# Altium schematic symbol library CUSTOM SCH - Copy.SchLib: 494 symbols (part 2 of 6) (continued)
## FPC 15 Pin
designator J12, comment MIPI  (value not drawn)
15 Position FPC Connector Contacts, Vertical - 1 Sided Pitch  0.039" (1.00mm); Manufacturer Part Number: 1-1734248-5; Case/Package: SMD
footprint TE_1-1734248-5
footprint TE_1-1734248-5 (FPC 15 PIn 1mm pitch)
pins: 1, 2, 3, 4, 5, 6, 7, 8, 9, 10, 11, 12, 13, 14, 15

## FPC 20Pin P0.5
designator J?, comment F0501-B-20-20T-R  Case/Package: SMD,P=0.5mm
Manufacturer Part Number: F0501-B-20-20T-R
footprint FPC_20P-P0.50_L4.4-W15.6
pins: 1, 2, 3, 4, 5, 6, 7, 8, 9, 10, 11, 12, 13, 14, 15, 16, 17, 18, 19, 20

## FPC 26Pin P0.5_
designator J?, comment F0501-B-20-20T-R  Case/Package: SMD,P=0.5mm
Manufacturer Part Number: F0501-B-20-20T-R
footprint FPC_20P-P0.50_L4.4-W15.6
pins: 1, 2, 3, 4, 5, 6, 7, 8, 9, 10, 11, 12, 13, 14, 15, 16, 17, 18, 19, 20, 21, 22, 23, 24, 25, 26

## FPC 40 PIN
designator J?  Manufacturer Part Number: F0501-B-40-20T-R  Case/Package: SMD P=0.5mm
FFC/FPC Connector, 40 Pin  Slide Lock Contact,Bottom SMD,P=0.5mm
footprint F0501-B-40-20T-R
footprint F0501-B-40-20T-R
pins: 1, 2, 3, 4, 5, 6, 7, 8, 9, 10, 11, 12, 13, 14, 15, 16, 17, 18, 19, 20, 21, 22, 23, 24, 25, 26, 27, 28, 29, 30, 31, 32, 33, 34, 35, 36, 37, 38, 39, 40

## FR107
designator D?
Rectifiers 1.0 Amp 1000 Volt 150ns; Mfr. No: FR107; Value: Rectifiers 1.0 Amp 1000 Volt 150ns; Package: DO-41
footprint DO-41_VERTICAL (Diode, Axial; Body 5.2 x 2.7 mm (LxDia. max), Lead Dia. 0.86 mm (max))
pins: 1 K, 2 A

## FRC
designator J?
10 Pin FRC Box Header Vertical TH; Case/Package: TH; Manufacturer Part Number: 10 Pin FRC Box Header
footprint FRC_10PIN
pins: 1 3V3, 2 GND, 3 VSYNC, 4 SCL, 5 HREF, 6 SDA, 7 RESET, 8 D0, 9 D1, 10 D2

## FRC_1
designator J?
10 Pin FRC Box Header
footprint FRC_10PIN
pins: 1 3V3, 2 GND, 3 VSYNC, 4 SCL, 5 HREF, 6 SDA, 7 RESET, 8 D0, 9 D1, 10 D2

## FRC_2
designator J?
10 Pin FRC Box Header
footprint FRC_10PIN
pins: 11 D3, 12 D4, 13 D5, 14 D6, 15 D7, 16 PCLK, 17, 18 PWDN, 19, 20

## FS8205A
designator U?  (value not drawn)
Dual N-Channel Mosfet TSSOP-8 (Sunrom:5292); Value: 5.0A; Case/Package: TSSOP-8; Manufacturer Part Number: FS8205A
footprint TSSOP8
pins: 1, 2, 3, 4, 5, 6, 7, 8

## FSM2JSMA
designator S?
Grey Button Tactile Switch, SPST 50 mA 0.71mm Surface Mount; Manufacturer_Name: TE Connectivity; Manufacturer_Part_Number: FSM2JSMA; RS Part Number: 8750595; RS Price/Stock: http://uk.rs-online.com/web/p/products/8750595; Mouser Part Number: 506-FSM2JSMA; Mouser Price/Stock: https://www.mouser.com/Search/Refine.aspx?Keyword=506-FSM2JSMA; Datasheet Link: http://www.te.com/commerce/DocumentDelivery/DDEController?Action=showdoc&DocId=Customer+Drawing%7F2-1437565-7%7FV%7Fpdf%7FEnglish%7FENG_CD_2-1437565-7_V.pdf%7F2-1437565-7
footprint FSM2J
pins: 1, 2, 3, 4

## FT2232D
designator U?
Dual USB to Serial UART/FIFO IC; Manufacturer Part Number: FT2232D; Case/Package: LQFP-48
footprint FT2232D (48-LQFP (7x7))
pins: 1 EESK, 2 EEDATA, 3 VCC_1, 4 RESET#, 5 RSTOUT#, 6 3V3OUT, 7 USBDP, 8 USBDM, 9 GND_1, 10 SI/WUA, 11 ACBUS3, 12 ACBUS2, 13 ACBUS1, 14 VCCIOA, 15 ACBUS0, 16 ADBUS7, 17 ADBUS6, 18 GND_2, 19 ADBUS5, 20 ADBUS4, 21 ADBUS3, 22 ADBUS2, 23 ADBUS1, 24 ADBUS0, 25 GND_3, 26 SI/WUB, 27 BCBUS3, 28 BCBUS2, 29 BCBUS1, 30 BCBUS0, 31 VCCIOB, 32 BDBUS7, 33 BDBUS6, 34 GND_4, 35 BDBUS5, 36 BDBUS4, 37 BDBUS3, 38 BDBUS2, 39 BDBUS1, 40 BDBUS0, 41 PWREN#, 42 VCC_2, 43 XTIN, 44 XTOUT, 45 AGND, 46 AVCC, 47 TEST, 48 EECS

## FT4232H-56Q
designator U?  Manufacturer Part Number: FT4232H-56Q-REEL
USB Interface IC Quad 480Mbs 4 UART USB 2.0 12Mbit; Manufacturer: FTDI; Min Supply Voltage: 1.62V; Max Supply Voltage: 1.98V; Supplier 1: Digi-Key; RoHS: Yes; Category: Integrated Circuits (ICs); Pricing 1: 1=7.25000, 10=7.04000, 50=6.39000, 100=5.97000, 500=5.78004, 1000=5.39002 (USD); Case/Package: VQFN-56; Number of Pins: 64; Min Operating Temperature: -40°C; Max Operating Temperature: 85°C; Packaging: Tape and Reel; REACH SVHC: No SVHC; ComponentLink1URL: http://www.mouser.com/ds/2/163/DS_FT4232H-9150.pdf?src-supplier=Mouser; ComponentLink1Description: http://www.mouser.com/ds/2/163/DS_FT4232H-9150.pdf?src-supplier=Mouser; ComponentLink2URL: http://www.farnell.com/datasheets/2200174.pdf?src-supplier=Farnell; ComponentLink2Description: http://www.farnell.com/datasheets/2200174.pdf?src-supplier=Farnell; ComponentLink3URL: http://www.ftdichip.com/Support/Documents/AppNotes/AN_128_User_Guide_For_FT4232H_Factory%20test%20utility.pdf?src-supplier=Digi-Key; ComponentLink3Description: http://www.ftdichip.com/Support/Documents/AppNotes/AN_128_User_Guide_For_FT4232H_Factory%20test%20utility.pdf?src-supplier=Digi-Key; ComponentLink4URL: http://www.farnell.com/datasheets/2200174.pdf?src-supplier=Newark; ComponentLink4Description: http://www.farnell.com/datasheets/2200174.pdf?src-supplier=Newark; ComponentLink5URL: http://www.farnell.com/datasheets/2200174.pdf?src-supplier=Element14; ComponentLink5Description: http://www.farnell.com/datasheets/2200174.pdf?src-supplier=Element14; Supplier Part Number 1: 768-1378-1-ND
footprint VQFN-56(8x8)
pins: 1 EECS, 2 VCORE, 3 OSCI, 4 OSCO, 5 VPHY, 6 REF, 7 DM, 8 DP, 9 VPLL, 10 TEST, 11 ~{RESET}, 12 ADBUS0, 13 ADBUS1, 14 ADBUS2, 15 ADBUS3, 16 VCCIO, 17 ADBUS4, 18 ADBUS5, 19 ADBUS6, 20 ADBUS7, 21 GND, 22 BDBUS0, 23 BDBUS1, 24 BDBUS2, 25 BDBUS3, 26 BDBUS4, 27 BDBUS5, 28 BDBUS6, 29 BDBUS7, 30 ~{SUSPEND}, 31 VCORE, 32 CDBUS0, 33 CDBUS1, 34 CDBUS2, 35 CDBUS3, 36 VCCIO, 37 CDBUS4, 38 CDBUS5, 39 CDBUS6, 40 CDBUS7, 41 GND, 42 DDBUS0, 43 VREGOUT, 44 VREGIN, 45 GND, 46 DDBUS1, 47 DDBUS2, 48 DDBUS3, 49 DDBUS4, 50 VCCIO, 51 DDBUS5, 52 DDBUS6, 53 DDBUS7, 54 ~{PWREN}, 55 EEDATA, 56 EECLK, 57 GND

## FUSB302BMPX
designator U?  Case/Package: MLP 14 Leads  Manufacturer Part Number: FUSB302BMPX
Programmable USB Type-C Controller w/PD
footprint 14-MLP (2.5x2.5)
pins: 1 CC2_1, 2 VBUS, 3 VDD_3 (power), 4 VDD_4 (power), 5 INT#, 6 SCL, 7 SDA, 8 GND_8 (power), 9 GND_9 (power), 10 CC1_10, 11 CC1_11, 12 VCONN_12, 13 VCONN_13, 14 CC2_14, 15 ePAD (power)

## GDT
designator GT?
pins: 1, 2

## GHR-06V-S
designator J?
6 pin Receptable of SM06B; Manufacturer Part Number: GHR-06V-S; Case/Package: Receptable; Link: https://www.aliexpress.com/item/33046444051.html?spm=a2g0o.productlist.0.0.6905681c6A8VYp&algo_pvid=ada6543f-3082-480f-a1c6-79924c9b0228&algo_exp_id=ada6543f-3082-480f-a1c6-79924c9b0228-7&pdp_ext_f=%7B%22sku_id%22%3A%2267404086081%22%7D

## GHR-10V-S
designator J?
10 in Receptable of SM10B; Manufacturer Part Number: GHR-10V-S; Case/Package: Receptable; Link: https://www.aliexpress.com/item/33049565374.html?spm=a2g0o.detail.0.0.45723f4fL7lF9l&gps-id=pcDetailBottomMoreThisSeller&scm=1007.13339.169870.0&scm_id=1007.13339.169870.0&scm-url=1007.13339.169870.0&pvid=b199a0d8-d4aa-4a42-8de8-7d31300f8e50&_t=gps-id:pcDetailBottomMoreThisSeller,scm-url:1007.13339.169870.0,pvid:b199a0d8-d4aa-4a42-8de8-7d31300f8e50,tpp_buckets:668%232846%238111%231996&&pdp_ext_f=%7B%22sceneId%22:%223339%22,%22sku_id%22:%2267399547622%22%7D

## GL823
designator U?
USB 2.0 SD/MMC Card Reader Controller; Manufacturer Part Number: GL823; Case/Package: QFN24; Value: *
pins: 1 SCL, 2 SDA, 3 DM, 4 DP, 5 RREF, 6 AVDD, 7 RSTZ, 8 SD_WP, 9 SD_CDZ, 10 D1, 11 D0, 12 SD_CLK, 13 DVDD, 14 PMOS, 15 GPIO8, 16 SD_CMD, 17 GPIO9, 18 D3, 19 D2, 20 LED, 21 TEST, 22 GPIO3, 23 DVDD, 24 GND, 25 G1
text: Version (A)

## GL850G-HHY22
designator U?
USB 2.0 Hub Controller Support 4 downstream ports; Manufacturer Part Number: GL850G-HHY22; Case/Package: SSOP-28; Value: *
footprint SSOP-28
pins: 1 AVDD_1, 2 DM2, 3 DP2, 4 RREF, 5 AVDD_2, 6 X1, 7 X2, 8 DM3, 9 DP3, 10 AVDD_3, 11 DM4, 12 DP4, 13 RESET#, 14 TEST/SCL, 15 GND, 16 DVDD, 17 PSELF, 18 PGANG, 19 OVCUR2#, 20 PWREN2#, 21 OVCUR1#, 22 PWREN1#, 23 V5, 24 V33, 25 DM0, 26 DP0, 27 DM1, 28 DP1

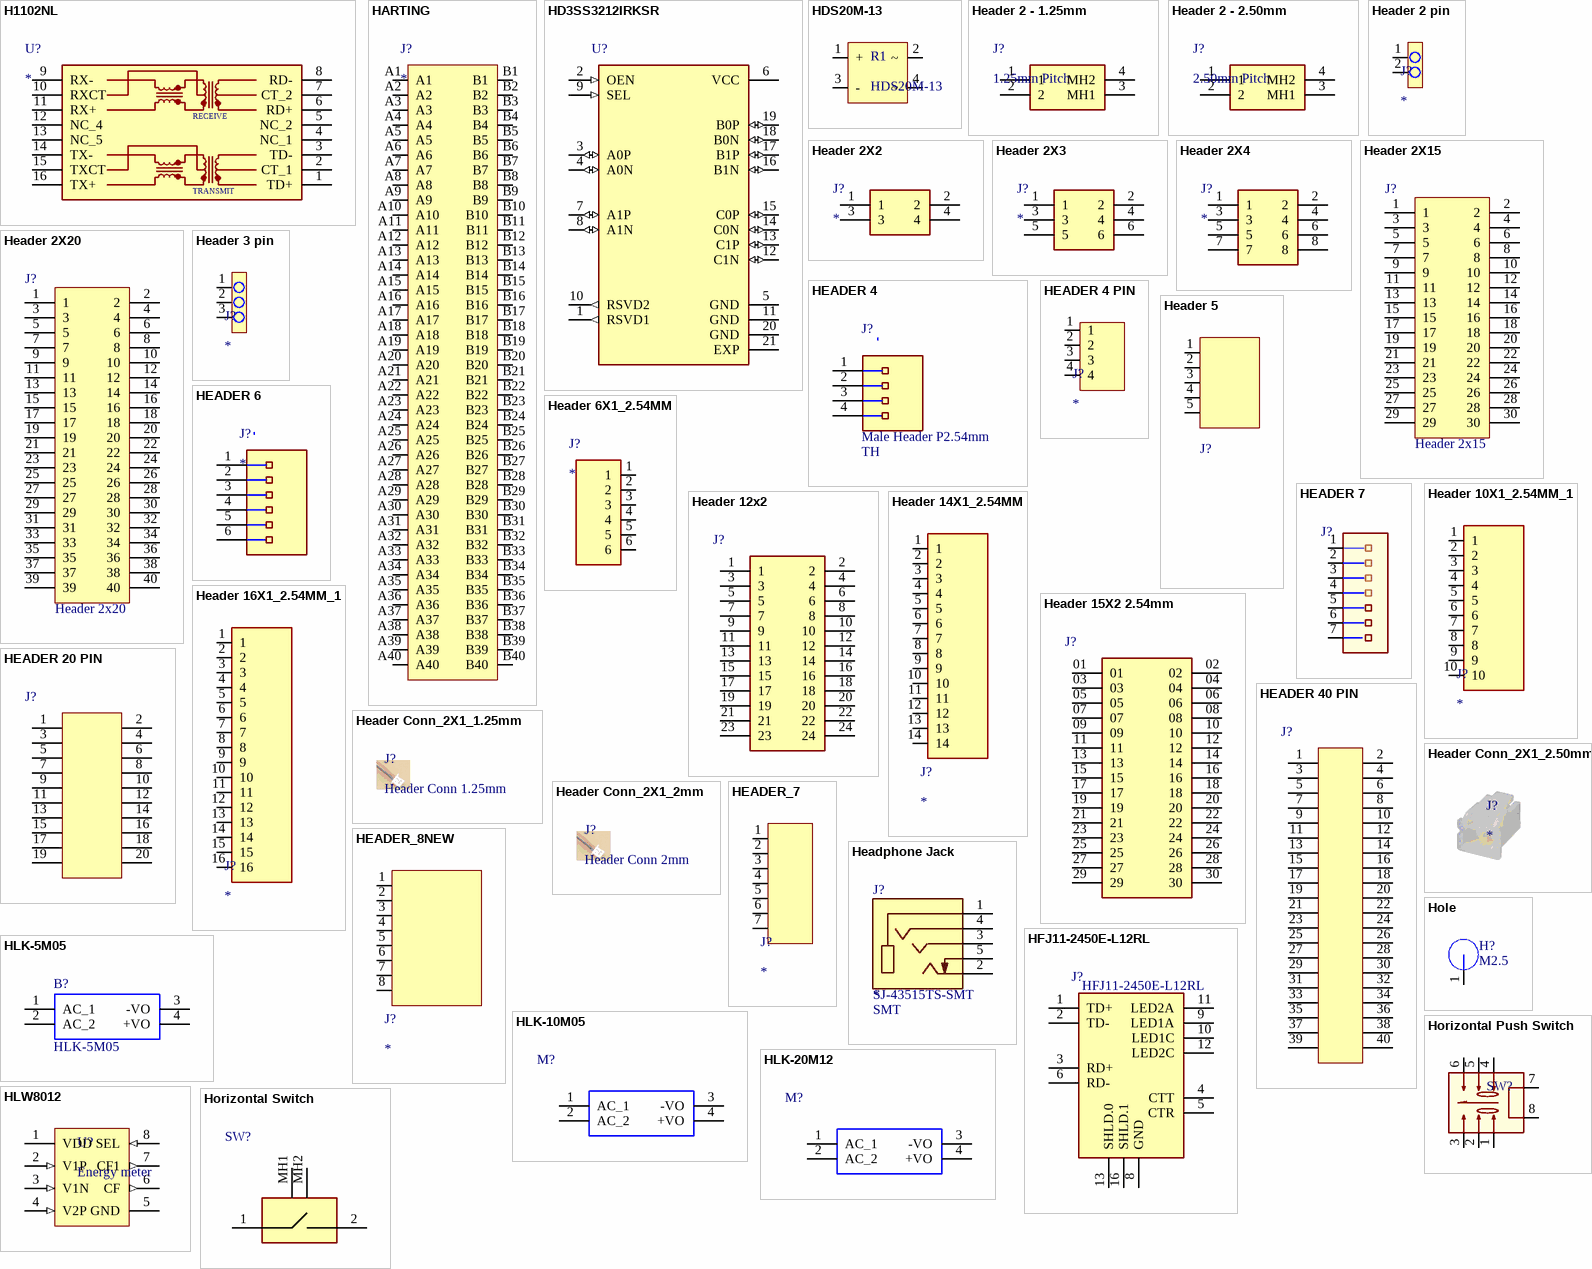
[diagram p13: symbols H1102NL to Horizontal Switch]

## H1102NL
designator U?
PULSE ELECTRONICS - H1102NL - LAN TRANSFORMER; Manufacturer Part Number: H1102NL; Case/Package: SOP16
footprint SOIC127P940X597-16N
pins: 1 TD+, 2 CT_1, 3 TD-, 4 NC_1, 5 NC_2, 6 RD+, 7 CT_2, 8 RD-, 9 RX-, 10 RXCT, 11 RX+, 12 NC_4, 13 NC_5, 14 TX-, 15 TXCT, 16 TX+
text: RECEIVE; TRANSMIT

## HARTING
designator J?
Connector Header Surface Mount 80 position 0.050" (1.27mm); Manufacturer Part Number: 15130802601000; Case/Package: *
pins: A1, A2, A3, A4, A5, A6, A7, A8, A9, A10, A11, A12, A13, A14, A15, A16, A17, A18, A19, A20, A21, A22, A23, A24, A25, A26, A27, A28, A29, A30, A31, A32, A33, A34, A35, A36, A37, A38, A39, A40, B1, B2, B3, B4, B5, B6, B7, B8, B9, B10, B11, B12, B13, B14, B15, B16, B17, B18, B19, B20, B21, B22, B23, B24, B25, B26, B27, B28, B29, B30, B31, B32, B33, B34, B35, B36, B37, B38, B39, B40

## HD3SS3212IRKSR
designator U?
Multiplexer Switch ICs Two Channel Differential 2:1/1:2 USB3.1 Mux/Demux 20-VQFN -40 to 85; Manufacturer 1: Texas Instruments; Manufacturer Part Number: HD3SS3212IRKSR; Min Supply Voltage: 3V; Max Supply Voltage: 3.6V; Data Rate: 480Mbps; Number of Ports: 2; Bandwidth: 8GHz; Supplier 1: Digi-Key; RoHS: Yes; Category: Interface ICs; Stock 1: 161; Pricing 1: 1=1.83000, 10=1.64300, 25=1.55000, 100=1.24000, 250=1.08500, 500=1.05400, 1000=0.83700 (USD); Case/Package: VQFN-20; Number of Pins: 20; Min Operating Temperature: -40°C; Max Operating Temperature: 85°C; Packaging: Tape and Reel; USB Standard: USB 3.1; REACH SVHC: No SVHC; Lead Free: Lead Free; ComponentLink1URL: http://www.ti.com/general/docs/lit/getliterature.tsp?genericPartNumber=HD3SS3212&&fileType=pdf&src-supplier=Farnell; ComponentLink1Description: http://www.ti.com/general/docs/lit/getliterature.tsp?genericPartNumber=HD3SS3212&&fileType=pdf&src-supplier=Farnell; ComponentLink2URL: http://www.ti.com/lit/ds/symlink/hd3ss3212.pdf?src-supplier=Digi-Key; ComponentLink2Description: http://www.ti.com/lit/ds/symlink/hd3ss3212.pdf?src-supplier=Digi-Key; ComponentLink3URL: http://www.ti.com/lit/gpn/hd3ss3212?src-supplier=Mouser; ComponentLink3Description: http://www.ti.com/lit/gpn/hd3ss3212?src-supplier=Mouser; ComponentLink4URL: http://www.ti.com/general/docs/lit/getliterature.tsp?genericPartNumber=HD3SS3212&&fileType=pdf&src-supplier=Element14; ComponentLink4Description: http://www.ti.com/general/docs/lit/getliterature.tsp?genericPartNumber=HD3SS3212&&fileType=pdf&src-supplier=Element14; Supplier Part Number 1: 296-42306-1-ND
footprint VQFN-20
pins: 1 RSVD1 (out), 2 OEN (in), 3 A0P (io), 4 A0N (io), 5 GND (power), 6 VCC (power), 7 A1P (io), 8 A1N (io), 9 SEL (in), 10 RSVD2 (out), 11 GND (power), 12 C1N (io), 13 C1P (io), 14 C0N (io), 15 C0P (io), 16 B1N (io), 17 B1P (io), 18 B0N (io), 19 B0P (io), 20 GND (power), 21 EXP (power)

## HDS20M-13
designator R1
footprint HDS20M-13 (Bridge Rectifiers Bridge Rectifier HDS)
pins: 1 +, 2 ~, 3 -, 4 ~

## Header 2 - 1.25mm
designator J?, comment 1.25mm Pitch
Headers & Wire Housings Wire-to-board,1.25mm Wafer SMT Vrt,2P,Tin; Manufacturer_Part_Number: 10114828-10102LF; Case/Package: SMD 2P 1.25mm Pitch
footprint Header SMD_2X1_1.25MM
pins: 1, 2, 3 MH1, 4 MH2

## Header 2 - 2.50mm
designator J?, comment 2.50mm Pitch
Headers & Wire Housings Wire-to-board,2.50mm Wafer SMT Vrt,2P,Tin; Manufacturer_Part_Number: BM02B-XASS-TF(LF)(SN); Case/Package: SMD 2P 2.50mm Pitch
footprint Header SMD_2X1_1.25MM
footprint Header SMD_2X1_2.50MM (B2BPHSM4TBLFSN)
pins: 1, 2, 3 MH1, 4 MH2

## Header 2 pin
designator J?
pins: 1, 2

## Header 2X2
designator J?
2x2 straight pin header 2.54mm Pitch; Manufacturer Part Number: 826656-2; Case/Package: TH
footprint Header 2X2 (2.54mm Pitch)
pins: 1, 2, 3, 4

## Header 2X3
designator J?
Headers & Wire Housings .100" Terminal Strip; Manufacturer_Part_Number: TSW-103-08-S-D; Case/Package: Th 2.54mm Pitch
footprint Header 2X3
pins: 1, 2, 3, 4, 5, 6

## Header 2X4
designator J?
Headers & Wire Housings ECONOSTIK HEADER DR VT TH 2X4; Manufacturer Part Number: 10129381-908002BLF; Case/Package: TH
footprint Header 2X4
pins: 1, 2, 3, 4, 5, 6, 7, 8

## Header 2X15
designator J?  Manufacturer Part Number: Header 2x15
Header, 30 Pin  2.54mm pitch; Case/Package: TH
footprint Header_15X2_2.54
pins: 1, 2, 3, 4, 5, 6, 7, 8, 9, 10, 11, 12, 13, 14, 15, 16, 17, 18, 19, 20, 21, 22, 23, 24, 25, 26, 27, 28, 29, 30

## Header 2X20
designator J?  Manufacturer Part Number: Header 2x20
Header, 40 Pin  2.54mm pitch; Case/Package: TH
footprint HEADER 2X20
pins: 1, 2, 3, 4, 5, 6, 7, 8, 9, 10, 11, 12, 13, 14, 15, 16, 17, 18, 19, 20, 21, 22, 23, 24, 25, 26, 27, 28, 29, 30, 31, 32, 33, 34, 35, 36, 37, 38, 39, 40

## Header 3 pin
designator J?
pins: 1, 2, 3

## HEADER 4
designator J?, comment Manufacturer Part Numbereter: Male Header P2.54mm  Case/Package: TH  (hidden comment: HEADER)
Male header P=2.54mm TH
footprint Header 4 (Male header 2.54mm Pitch)
pins: 1, 2, 3, 4

## HEADER 4 PIN
designator J?
footprint HEADER_4X1_2.54 (Male header 2.54mm Pitch)
pins: 1, 2, 3, 4

## Header 5
designator J?
Header, 5-Pin; LatestRevisionDate: 17-Jul-2002; LatestRevisionNote: Re-released for DXP Platform.; Publisher: Altium Limited
footprint HDR1X5 (Connector; Header; 5 Position)
signal-integrity model Connector
footprint HEADER_5X1_2.54 (2.54mm Pitch)
pins: 1, 2, 3, 4, 5

## HEADER 6
designator J?
pins: 1, 2, 3, 4, 5 4, 6

## Header 6X1_2.54MM
designator J?
Manufacturer Part Numbereter: TH 2.54MM; Case/Package: TH
footprint Model Name (Footprint not found)
footprint 6 Pin Header
pins: 1, 2, 3, 4, 5, 6

## HEADER 7
designator J?
mm PITCH HEADER, 7PIN; Case/Package: TH; Manufacturer Part Number: mm PITCH HEADER, 7PIN
pins: 1, 2, 3, 4, 5 4, 6, 7

## Header 10X1_2.54MM_1
designator J?
Manufacturer Part Number: TH 2.54MM; Case/Package: TH
footprint 8 Pin Header (2.54mm Pitch)
footprint HEADER_10X1_2.54 (2.54mm Pitch)
pins: 1, 2, 3, 4, 5, 6, 7, 8, 9, 10

## Header 12x2
designator J?
Connector; Manufacturer Part Number: TH P2.54mm; Case/Package: TH
footprint HEADER_12X2_2.54MM
pins: 1, 2, 3, 4, 5, 6, 7, 8, 9, 10, 11, 12, 13, 14, 15, 16, 17, 18, 19, 20, 21, 22, 23, 24

## Header 14X1_2.54MM
designator J?
Manufacturer Part Number: TH 2.54MM; Case/Package: TH
footprint 8 Pin Header (2.54mm Pitch)
pins: 1, 2, 3, 4, 5, 6, 7, 8, 9, 10, 11, 12, 13, 14

## Header 15X2 2.54mm
designator J?  (value not drawn)
Connector Header position; Manufacturer Part Number: Th P2.54MM; Case/Package: TH; Parameter 1: *
footprint Header_15X2_2.54MM
footprint Header_15X2_2.54
pins: 01, 02, 03, 04, 05, 06, 07, 08, 09, 10, 11, 12, 13, 14, 15, 16, 17, 18, 19, 20, 21, 22, 23, 24, 25, 26, 27, 28, 29, 30

## Header 16X1_2.54MM_1
designator J?
Manufacturer Part Number: TH 2.54MM; Case/Package: TH; Parameter 1: *
footprint 8 Pin Header (2.54mm Pitch)
footprint HEADER_16X1_2.54 - (2.54mm Pitch)
pins: 1, 2, 3, 4, 5, 6, 7, 8, 9, 10, 11, 12, 13, 14, 15, 16

## HEADER 20 PIN
designator J?  (value not drawn)
pins: 1, 2, 3, 4, 5, 6, 7, 8, 9, 10, 11, 12, 13, 14, 15, 16, 17, 18, 19, 20

## HEADER 40 PIN
designator J?  (value not drawn)
pins: 1, 2, 3, 4, 5, 6, 7, 8, 9, 10, 11, 12, 13, 14, 15, 16, 17, 18, 19, 20, 21, 22, 23, 24, 25, 26, 27, 28, 29, 30, 31, 32, 33, 34, 35, 36, 37, 38, 39, 40

## Header Conn_2X1_1.25mm
designator J?, comment Header Conn 1.25mm  (mechanical)
Manufacturer Part Number: Sunrom 6291

## Header Conn_2X1_2.50mm
designator J?  (mechanical)
Manufacturer Part Number: XAP-02V-1; Case/Package: Wire House; ComponentLink1Description: New link; ComponentLink1URL: https://www.digikey.sg/product-detail/en/jst-sales-america-inc/XAP-02V-1/455-1903-ND/923774

## Header Conn_2X1_2mm
designator J?, comment Header Conn 2mm  (mechanical)
Manufacturer Part Number: Sunrom 6377

## HEADER_7
designator J?
pins: 1 7, 2, 3, 4, 5, 6, 7

## HEADER_8NEW
designator J?
footprint HEADER8 1.459PICTH
pins: 1 9, 2 10, 3 11, 4 12, 5 13, 6 14, 7 15, 8 16

## Headphone Jack
designator J?  Manufacturer Part Number: SJ-43515TS-SMT  Case/Package: SMT
3.5 mm, 4 Conductors, Right Angle, Surface Mount _SMT_, Audio Jack Connector
footprint CUI_SJ-43515TS-SMT
footprint SJ-43515TS-SMT (Headphone jack female)
pins: 1 SLEEVE, 2 TIP, 3 RING1, 4 RING2, 5 TIP_SWITCH

## HFJ11-2450E-L12RL
designator J?  Manufacturer Part Number: HFJ11-2450E-L12RL
Modular Connectors / Ethernet Connectors 10/100 1x1 Tab Down RJ45 w/mag G/Y LED; Manufacturer: HALO; Gender: Female; Connector Type: RJ45,Socket; Number of Positions Loaded: 8; Number of Ports: 1; Pitch: 2.54mm; Supplier 1: Mouser; Stock 1: 1298; Pricing 1: 1=8.95, 10=8.95, 50=5.36, 100=4.47, 1000=2.68, 10000=2.68 (USD); Mount: Through Hole; Contact Plating: Gold; Contact Material: Ferrite; Packaging: Rail/Tube; Number of Contacts: 8; Termination: Solder; Number of Positions: 8; Orientation: Right Angle; Length: 15.88mm; Depth: 21.59mm; Radiation Hardening: No; Lead Free: Lead Free; ComponentLink1URL: http://www.haloelectronics.com/pdf/fastjack-100baset.pdf?src-supplier=Avnet+Europe; ComponentLink1Description: http://www.haloelectronics.com/pdf/fastjack-100baset.pdf?src-supplier=Avnet+Europe; ComponentLink2URL: https://www.verical.com/server-webapp/html/getDatasheet?partID=566425&src-supplier=Verical; ComponentLink2Description: https://www.verical.com/server-webapp/html/getDatasheet?partID=566425&src-supplier=Verical; ComponentLink3URL: http://www.haloelectronics.com/pdf/fastjack-10-100-tx.pdf?src-supplier=Future+Electronics; ComponentLink3Description: http://www.haloelectronics.com/pdf/fastjack-10-100-tx.pdf?src-supplier=Future+Electronics; ComponentLink4URL: http://uk.rs-online.com/webdocs/106e/0900766b8106e817.pdf?src-supplier=RSComponents; ComponentLink4Description: http://uk.rs-online.com/webdocs/106e/0900766b8106e817.pdf?src-supplier=RSComponents; ComponentLink5URL: http://www.haloelectronics.com/pdf/fastjack-10-100-tx.pdf?src-supplier=Avnet; ComponentLink5Description: http://www.haloelectronics.com/pdf/fastjack-10-100-tx.pdf?src-supplier=Avnet; Supplier Part Number 1: 493-HFJ112450EL12RL
footprint HFJ11-2450E-L11RL
pins: 1 TD+, 2 TD-, 3 RD+, 4 CTT, 5 CTR, 6 RD-, 8 GND, 9 LED1A, 10 LED1C, 11 LED2A, 12 LED2C, 13 SHLD.0, 16 SHLD.1

## HLK-5M05
designator B?
5W ultra-compact power module HLK-5M05; Manufacturer_Name: Hi-Link; Geometry.Height: 18mm; Manufacturer_Part_Number: HLK-5M05; RS Part Number: *; RS Price/Stock: *; Mouser Part Number: *; Mouser Price/Stock: *; Datasheet Link: https://hacktronics.co.in/step-down-power-supply/ac-dc-220v-ac-to-5v-dc-5w-pcb-mounted-plastics-enclosed-isolated-switching-step-down-power-supply-module
footprint es1a
pins: 1 AC_1, 2 AC_2, 3 -VO, 4 +VO

## HLK-10M05
designator M?  (value not drawn)
pins: 1 AC_1, 2 AC_2, 3 -VO, 4 +VO

## HLK-20M12
designator M?  (value not drawn)
Manufacturer Part Number: HLK-20M12; Case/Package: TH
pins: 1 AC_1, 2 AC_2, 3 -VO, 4 +VO

## HLW8012
designator U?, comment Energy meter
pins: 1 VDD (power), 2 V1P (in), 3 V1N (in), 4 V2P (in), 5 GND (power), 6 CF (out), 7 CF1 (out), 8 SEL (in)

## Hole
designator H?  Case/Package: M2.5  (no BOM)
D=2.7mm, 6mm mask; Manufacturer Part Number: *
footprint H3.8MM
footprint HOLE_C3R20_C6R00
footprint Hole (D=2.7mm)
pins: 1

## Horizontal Push Switch
designator SW?
Black Projected Plunger LATCHING DPDT 100MΩ -15℃~+55℃ 250gf@±80gf 10000 24.9mm 300mA 7.8mm 50V Plugin Push Switches - Horizontal Type ROHS; Manufacturer Part Number: XKBS22E05-Z; Case/Package: TH
footprint Horizontal Push Switch
pins: 1, 2, 3, 4, 5, 6, 7, 8

## Horizontal Switch
designator SW?  (value not drawn)
footprint vertical pushbutton - duplicate
pins: 1, 2, MH1, MH2

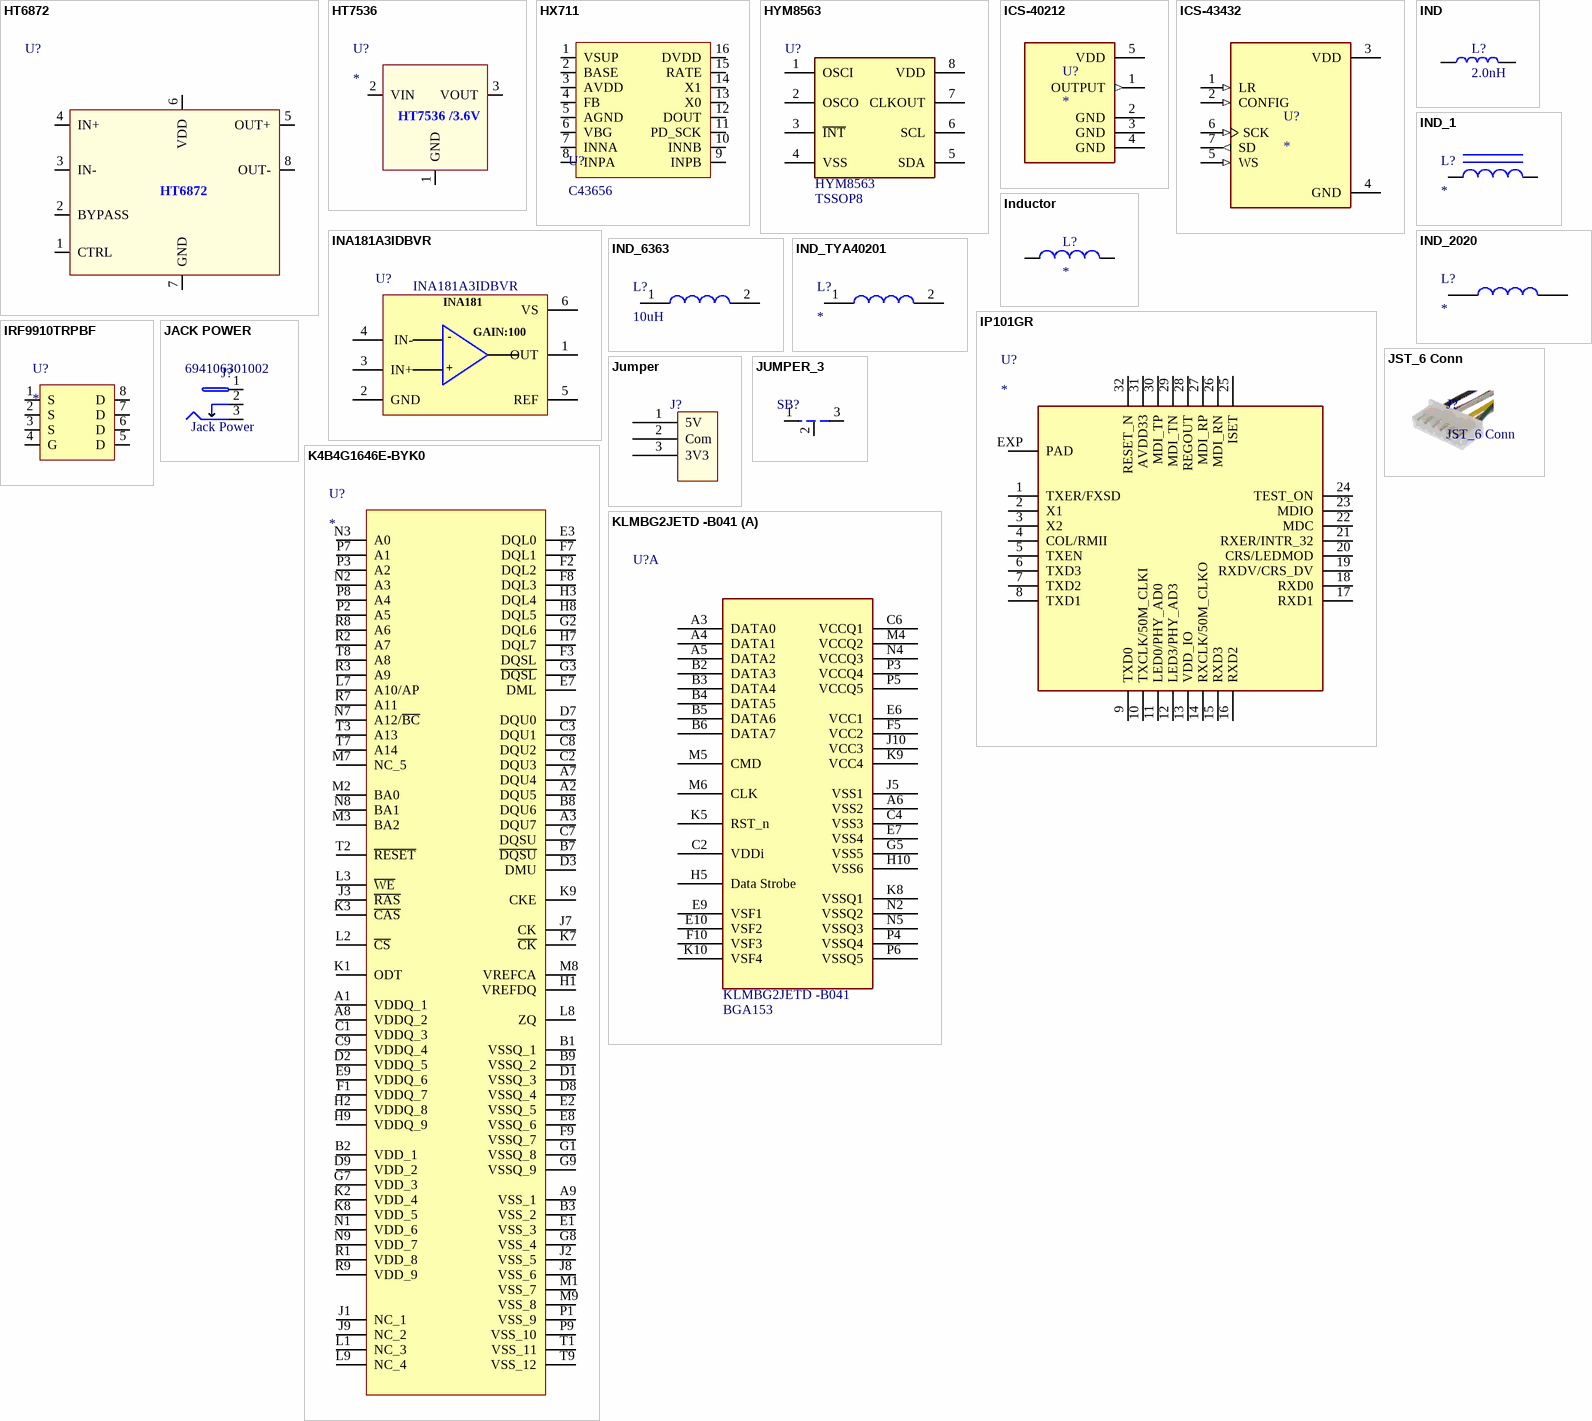
[diagram p14: symbols HT6872 to KLMBG2JETD -B041]

## HT6872
designator U?
pins: 1 CTRL, 2 BYPASS, 3 IN-, 4 IN+, 5 OUT+, 6 VDD, 7 GND, 8 OUT-

## HT7536
designator U?
pins: 1 GND, 2 VIN, 3 VOUT
text: HT7536 /3.6V

## HX711
designator U?, comment C43656
SOP-16_150mil Analog To Digital Converters (ADCs) ROHS; Manufacturer Part Number: HX711; Case/Package: SOP-16_150mil; ComponentLink1Description: New link; ComponentLink1URL: https://www.lcsc.com/product-detail/Analog-To-Digital-Converters-ADCs_Avia-Semicon-Xiamen-HX711_C43656.html
footprint SOP-16_150mil_
pins: 1 VSUP, 2 BASE, 3 AVDD, 4 FB, 5 AGND, 6 VBG, 7 INNA, 8 INPA, 9 INPB, 10 INNB, 11 PD_SCK, 12 DOUT, 13 X0, 14 X1, 15 RATE, 16 DVDD

## HYM8563
designator U?  Manufacturer Part Number: HYM8563  Case/Package: TSSOP8
I2C Real Time Clock/Calendar
footprint TSSOP8_3R10X3R10X1R10
footprint TSSOP8
pins: 1 OSCI, 2 OSCO, 3 ~{INT}, 4 VSS, 5 SDA, 6 SCL, 7 CLKOUT, 8 VDD

## ICS-40212
designator U?
35Hz ~ 20kHz Analog Microphone MEMS (Silicon) 1.52V ~ 3.63V Omnidirectional (-38dB Â±1dB @ 94dB SPL) Solder Pads; Manufacturer Part Number: ICS-40212; Value: *; Package: LGA-4 TDK-InvenSense
footprint MIC_ICS-40212
footprint MIC_ICS-40212
pins: 1 OUTPUT (out), 2 GND (power), 3 GND (power), 4 GND (power), 5 VDD (power)

## ICS-43432
designator U?
50Hz ~ 20kHz Digital, IÂ²S Microphone MEMS (Silicon) 1.62V ~ 3.63V Omnidirectional (-26dB Â±1dB @ 94dB SPL) Solder Pads; Manufacturer Part Number: ICS-43432; Case/Package: QFN-16 TDK InvenSense; Value: *
footprint MIC_ICS-43432
pins: 1 LR (in), 2 CONFIG (in), 3 VDD (power), 4 GND (power), 5 WS (in), 6 SCK (in), 7 SD (out)

## INA181A3IDBVR
designator U?
Automotive, 26V bi-directional current sense amplifier for cost-sensitive systems 6-SOT-23 -40 to 125; Manufacturer: Texas Instruments; Number of Circuits: 1; Slew Rate: 2V/µs; -3db Bandwidth: 350kHz; Operating Supply Current: 260uA; FET Type: 2 N-Channel; Drain to Source Voltage (Vdss): 60V; Rds On Max: 2.1mR; Input Capacitance: 4.84nF; Max Power Dissipation: 12W; Supplier 1: Digi-Key; RoHS: No; Category: Amplifiers - Op Amps, Buffer, Instrumentation; Stock 1: 8626; Pricing 1: 1=0.44000, 10=0.37500, 25=0.35000, 100=0.26000, 250=0.22000, 500=0.21000, 1000=0.15500 (USD); Mount: Surface Mount; Case/Package: SOT-23-6; Number of Pins: 22; Min Operating Temperature: -40°C; Max Operating Temperature: 125°C; Packaging: Cut Tape; ComponentLink1URL: http://www.ti.com/lit/ds/symlink/ina181.pdf?src-supplier=Digi-Key; ComponentLink1Description: http://www.ti.com/lit/ds/symlink/ina181.pdf?src-supplier=Digi-Key; Supplier Part Number 1: 296-47658-1-ND; Manufacturer Part Number: INA181A3IDBVR
footprint SOT-23-6
pins: 1 OUT, 2 GND, 3 IN+, 4  IN-, 5 REF, 6 VS
text: INA181; GAIN:100; -; +

## IND
designator L?, comment 2.0nH
Case/Package: 0603; Value: 2.0nH; Manufacturer Part Number: *
footprint L0603
pins: 1, 2

## IND_1
designator L?
Type: INDUCTOR; Manufacturer Part Number: *; Package: *; Vicharak-PN: *
pins: 1, 2

## IND_2020
designator L?
LQH5BPZ_T0 Series Inductor 1.5uH +/-30% 2020 (5050); Manufacturer_Part_Number: LQH5BPZ1R5NT0L; Case/Package: 2020 (5050); Value: 1.5uH
footprint IND_2020 (2020 (5050 metric))
pins: 1, 2

## IND_6363
designator L?, comment 10uH
IHLP2525CZ-11 Series Shielded Wire-wound SMD Inductor with a Metal Composite Core; Manufacturer_Name: Vishay; Manufacturer_Part_Number: IHLP2525CZER100M11; Value: 10uH; Case/Package: 6363  6.47*6.47*3mm
footprint INDM6965X300N
footprint IND_6363
pins: 1, 2

## IND_TYA40201
designator L?
Fixed Inductors 1uH 8.7A 20% Wire Wound; Manufacturer_Part_Number: TYA40201R0M-10; Value: 1uF; Case/package: SMD 4*4*2.1
footprint TYA40201R0M10
pins: 1, 2

## Inductor
designator L?
Manufacturer Part Number: *; Value: *; Case/Package: *
pins: 1, 2

## IP101GR
designator U?
Ethernet PHY CHIP RMII/MII; Manufacturer Part Number: IP101GR; Case/Package: None
footprint QFN32_4X4
pins: 1 TXER/FXSD, 2 X1, 3 X2, 4 COL/RMII, 5 TXEN, 6 TXD3, 7 TXD2, 8 TXD1, 9 TXD0, 10 TXCLK/50M_CLKI, 11 LED0/PHY_AD0, 12 LED3/PHY_AD3, 13 VDD_IO, 14 RXCLK/50M_CLKO, 15 RXD3, 16 RXD2, 17 RXD1, 18 RXD0, 19 RXDV/CRS_DV, 20 CRS/LEDMOD, 21 RXER/INTR_32, 22 MDC, 23 MDIO, 24 TEST_ON, 25 ISET, 26 MDI_RN, 27 MDI_RP, 28 REGOUT, 29 MDI_TN, 30 MDI_TP, 31 AVDD33, 32 RESET_N, EXP PAD

## IRF9910TRPBF
designator U?
P-Channel 30 V 20A (Tc) 2.5W (Ta) Surface Mount 8-SO; Manufacturer Part Number: IRF9310TRPBF; Case/Package: 8SO
pins: 1 S, 2 S, 3 S, 4 G, 5 D, 6 D, 7 D, 8 D

## JACK POWER
designator J?  Manufacturer Part Number: 694106301002  Connector Type: Jack Power
CONN PWR JACK 2.1X5.5MM SOLDER; Manufacturer: Wurth Electronics; Gender: Male; Shielding: Unshielded; Current Rating: 5A; Voltage Rating: 24V; Insulation Resistance: 100MR; Voltage Rating (DC): 20V; Supplier 1: Digi-Key; Stock 1: 3331; Pricing 1: 1=0.96, 10=0.908, 50=0.811, 100=0.746, 500=0.648, 1000=0.551 (USD); Mount: Through Hole; Contact Plating: Tin; Color: Black; Contact Material: Copper Alloy; Housing Material: Polyamide; Min Operating Temperature: -40°C; Max Operating Temperature: 85°C; Packaging: Bulk; Termination: Through Hole; Contact Gender: Female; Package Quantity: 500; REACH SVHC: Unknown; Flammability Rating: UL94 V-0; ComponentLink1URL: https://katalog.we-online.de/em/datasheet/6941xx301002.pdf?src-supplier=Digi-Key; ComponentLink1Description: https://katalog.we-online.de/em/datasheet/6941xx301002.pdf?src-supplier=Digi-Key; ComponentLink2URL: http://www.farnell.com/cad/2130967.pdf?src-supplier=Element14; ComponentLink2Description: http://www.farnell.com/cad/2130967.pdf?src-supplier=Element14; ComponentLink3URL: http://www.mouser.com/ds/2/445/6941xx301002-469315.pdf?src-supplier=Mouser; ComponentLink3Description: http://www.mouser.com/ds/2/445/6941xx301002-469315.pdf?src-supplier=Mouser; Supplier Part Number 1: 732-5930-ND
footprint 12V_PWR JACK (2.5 mm DC female jack)
pins: 1, 2, 3

## JST_6 Conn
designator J?  (mechanical)
Manufacturer Part Number: Sunrom 6295

## Jumper
designator J?
footprint Jumper (Chip Capacitor, Body 2.0x1.3mm, IPC High Density)
pins: 1 5V, 2 Com, 3 3V3

## JUMPER_3
designator SB?
footprint RESC0603-JUMPER_3
pins: 1, 2, 3

## K4B4G1646E-BYK0
designator U?
4Gb E-die DDR3L SDRAM; Manufacturer Part Number: K4B4G1646E-BYK0; Case/Package: 96FBGA
footprint BGA96C80P9X16_750X1330X120 (K4B4G1646E-BYK0)
pins: A1 VDDQ_1, A2 DQU5, A3 DQU7, A7 DQU4, A8 VDDQ_2, A9 VSS_1, B1 VSSQ_1, B2 VDD_1, B3 VSS_2, B7 ~{DQSU}, B8 DQU6, B9 VSSQ_2, C1 VDDQ_3, C2 DQU3, C3 DQU1, C7 DQSU, C8 DQU2, C9 VDDQ_4, D1 VSSQ_3, D2 VDDQ_5, D3 DMU, D7 DQU0, D8 VSSQ_4, D9 VDD_2, E1 VSS_3, E2 VSSQ_5, E3 DQL0, E7 DML, E8 VSSQ_6, E9 VDDQ_6, F1 VDDQ_7, F2 DQL2, F3 DQSL, F7 DQL1, F8 DQL3, F9 VSSQ_7, G1 VSSQ_8, G2 DQL6, G3 ~{DQSL}, G7 VDD_3, G8 VSS_4, G9 VSSQ_9, H1 VREFDQ, H2 VDDQ_8, H3 DQL4, H7 DQL7, H8 DQL5, H9 VDDQ_9, J1 NC_1, J2 VSS_5, J3 ~{RAS}, J7 CK, J8 VSS_6, J9 NC_2, K1 ODT, K2 VDD_4, K3 ~{CAS}, K7 ~{CK}, K8 VDD_5, K9 CKE, L1 NC_3, L2 ~{CS}, L3 ~{WE}, L7 A10/AP, L8 ZQ, L9 NC_4, M1 VSS_7, M2 BA0, M3 BA2, M7 NC_5, M8 VREFCA, M9 VSS_8, N1 VDD_6, N2 A3, N3 A0, N7 A12/~{BC}, N8 BA1, N9 VDD_7, P1 VSS_9, P2 A5, P3 A2, P7 A1, P8 A4, P9 VSS_10, R1 VDD_8, R2 A7, R3 A9, R7 A11, R8 A6, R9 VDD_9, T1 VSS_11, T2 ~{RESET}, T3 A13, T7 A14, T8 A8, T9 VSS_12

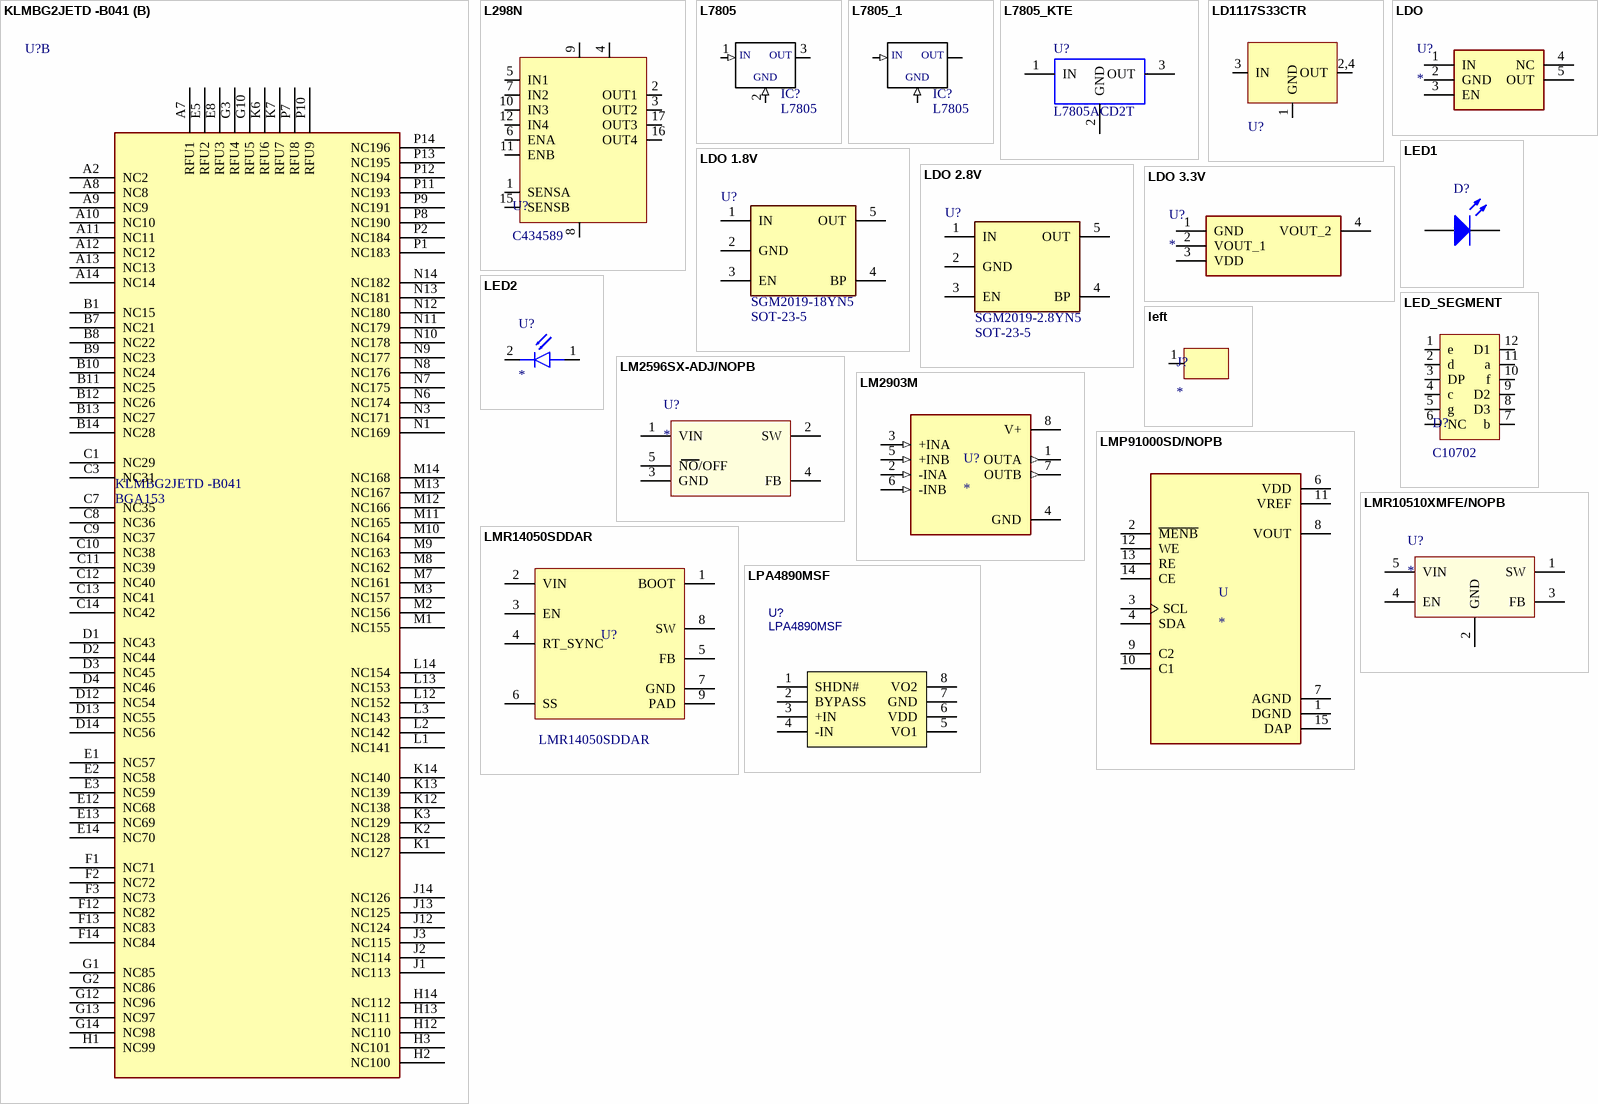
[diagram p15: symbols KLMBG2JETD -B041 to LPA4890MSF]

## KLMBG2JETD -B041
designator U?  Manufacturer Part Number: KLMBG2JETD -B041  Case/Package: BGA153
NAND_EMMC_153_2L
footprint BGA153
part A pins: A3 DATA0, A4 DATA1, A5 DATA2, A6 VSS2, B2 DATA3, B3 DATA4, B4 DATA5, B5 DATA6, B6 DATA7, C2 VDDi, C4 VSS3, C6 VCCQ1, E6 VCC1, E7 VSS4, E9 VSF1, E10 VSF2, F5 VCC2, F10 VSF3, G5 VSS5, H5 Data Strobe, H10 VSS6, J5 VSS1, J10 VCC3, K5 RST_n, K8 VSSQ1, K9 VCC4, K10 VSF4, M4 VCCQ2, M5 CMD, M6 CLK, N2 VSSQ2, N4 VCCQ3, N5 VSSQ3, P3 VCCQ4, P4 VSSQ4, P5 VCCQ5, P6 VSSQ5
part B pins: A2 NC2, A7 RFU1, A8 NC8, A9 NC9, A10 NC10, A11 NC11, A12 NC12, A13 NC13, A14 NC14, B1 NC15, B7 NC21, B8 NC22, B9 NC23, B10 NC24, B11 NC25, B12 NC26, B13 NC27, B14 NC28, C1 NC29, C3 NC31, C7 NC35, C8 NC36, C9 NC37, C10 NC38, C11 NC39, C12 NC40, C13 NC41, C14 NC42, D1 NC43, D2 NC44, D3 NC45, D4 NC46, D12 NC54, D13 NC55, D14 NC56, E1 NC57, E2 NC58, E3 NC59, E5 RFU2, E8 RFU3, E12 NC68, E13 NC69, E14 NC70, F1 NC71, F2 NC72, F3 NC73, F12 NC82, F13 NC83, F14 NC84, G1 NC85, G2 NC86, G3 RFU4, G10 RFU5, G12 NC96, G13 NC97, G14 NC98, H1 NC99, H2 NC100, H3 NC101, H12 NC110, H13 NC111, H14 NC112, J1 NC113, J2 NC114, J3 NC115, J12 NC124, J13 NC125, J14 NC126, K1 NC127, K2 NC128, K3 NC129, K6 RFU6, K7 RFU7, K12 NC138, K13 NC139, K14 NC140, L1 NC141, L2 NC142, L3 NC143, L12 NC152, L13 NC153, L14 NC154, M1 NC155, M2 NC156, M3 NC157, M7 NC161, M8 NC162, M9 NC163, M10 NC164, M11 NC165, M12 NC166, M13 NC167, M14 NC168, N1 NC169, N3 NC171, N6 NC174, N7 NC175, N8 NC176, N9 NC177, N10 NC178, N11 NC179, N12 NC180, N13 NC181, N14 NC182, P1 NC183, P2 NC184, P7 RFU8, P8 NC190, P9 NC191, P10 RFU9, P11 NC193, P12 NC194, P13 NC195, P14 NC196

## L298N
designator U?, comment C434589
Multiwatt15 Motor Driver ICs ROHS; Manufacturer Part Number: L298N; Case/Package: Multiwatt15; ComponentLink1Description: New link; ComponentLink1URL: https://www.lcsc.com/product-detail/Motor-Driver-ICs_HGSEMI-L298N_C434589.html
pins: 1 SENSA, 2 OUT1, 3 OUT2, 4 18, 5 IN1, 6 ENA, 7 IN2, 8 16, 9 19, 10 IN3, 11 ENB, 12 IN4, 15 SENSB, 16 OUT4, 17 OUT3

## L7805
designator IC?
MF: STMicroelectronics; Price: None; MP: L7805; SnapEDA_Link: https://www.snapeda.com/parts/L7805/STMicroelectronics/view-part/?ref=snap; Availability: Unavailable; Package: None; Value: *
footprint L7805
pins: 1 IN (in), 2 GND (in), 3 OUT

## L7805_1
designator IC?, comment L7805
MF: STMicroelectronics; Availability: Unavailable; Price: None; Package: None; MP: L7805; SnapEDA_Link: https://www.snapeda.com/parts/L7805/STMicroelectronics/view-part/?ref=snap; Value: *
footprint L7805
pins: 1 IN (in), 2 GND (in), 3 OUT

## L7805_KTE
designator U?, comment L7805ACD2T
Linear Voltage Regulators 5.0V 1.0A Positive; Mfr. No: L7805; Value: 5V Regulator; Package: KTE
footprint L7805_KTE
pins: 1 IN, 2 GND, 3 OUT